# Altium schematic symbol library jlcpcb_2025_04_inductors_extended_0402.schlib: 1396 symbols (part 1 of 8) (continued)
## CMCC1005C5N1SSP
designator L?  Inductance: 5.1nH
Inductor, 5.1nH, 0.26Ω, 400mA, SMD 0402; Manufacturer: Cybermax; Manufacturer Part Number: CMCC1005C5N1SSP; Self-Resonant Frequency: 4600MHz; Q Factor: 8@100MHz; Package Size: 0402; JLCPCB Basic Part: No; JLCPCB Part Number: C405022; Supplier 1: LCSC; Category: Inductors; Supplier Part Number 1: C405022; Rated Current: 400mA; DC Resistance: 0.26Ω; RoHS: Yes; ComponentLink1Description: Datasheet; ComponentLink1URL: https://wmsc.lcsc.com/wmsc/upload/file/pdf/v2/lcsc/2304140030_Cybermax-CMCC1005C5N1SSP_C405022.pdf; ComponentLink2Description: JLCPCB Part URL; ComponentLink2URL: https://jlcpcb.com/partdetail/C405022; ComponentLink3Description: LCSC Part URL; ComponentLink3URL: https://lcsc.com/product-detail/Inductors-SMD_Cybermax-Cybermax-CMCC1005C5N1SSP_C405022.html
footprint IND-0402 (0402 (1005M) Inductor)
pins: 1, 2

## CMCC1005C6N8SSP
designator L?  Inductance: 6.8nH
Inductor, 6.8nH, SMD 0402; Manufacturer: Cybermax; Manufacturer Part Number: CMCC1005C6N8SSP; Package Size: 0402; JLCPCB Basic Part: No; JLCPCB Part Number: C405025; Supplier 1: LCSC; Category: Inductors; Supplier Part Number 1: C405025; RoHS: Yes; ComponentLink1Description: Datasheet; ComponentLink1URL: https://wmsc.lcsc.com/wmsc/upload/file/pdf/v2/lcsc/2304140030_Cybermax-CMCC1005C6N8SSP_C405025.pdf; ComponentLink2Description: JLCPCB Part URL; ComponentLink2URL: https://jlcpcb.com/partdetail/C405025; ComponentLink3Description: LCSC Part URL; ComponentLink3URL: https://lcsc.com/product-detail/Inductors-SMD_Cybermax-Cybermax-CMCC1005C6N8SSP_C405025.html
footprint IND-0402 (0402 (1005M) Inductor)
pins: 1, 2

## CMCC1005C9N1JSP
designator L?  Inductance: 9.1nH
Inductor, 9.1nH, ±5%, 0.42Ω, 300mA, SMD 0402; Manufacturer: Cybermax; Manufacturer Part Number: CMCC1005C9N1JSP; Self-Resonant Frequency: 3200MHz; Q Factor: 8@100MHz; Package Size: 0402; JLCPCB Basic Part: No; JLCPCB Part Number: C405028; Supplier 1: LCSC; Category: Inductors; Supplier Part Number 1: C405028; Tolerance: ±5%; Rated Current: 300mA; DC Resistance: 0.42Ω; RoHS: Yes; ComponentLink1Description: Datasheet; ComponentLink1URL: https://wmsc.lcsc.com/wmsc/upload/file/pdf/v2/lcsc/2304140030_Cybermax-CMCC1005C9N1JSP_C405028.pdf; ComponentLink2Description: JLCPCB Part URL; ComponentLink2URL: https://jlcpcb.com/partdetail/C405028; ComponentLink3Description: LCSC Part URL; ComponentLink3URL: https://lcsc.com/product-detail/Inductors-SMD_Cybermax-Cybermax-CMCC1005C9N1JSP_C405028.html
footprint IND-0402 (0402 (1005M) Inductor)
pins: 1, 2

## CMCC1005C27NJSP
designator L?  Inductance: 27nH
Inductor, 27nH, ±5%, 0.9Ω, 200mA, SMD 0402; Manufacturer: Cybermax; Manufacturer Part Number: CMCC1005C27NJSP; Self-Resonant Frequency: 1.6GHz; Q Factor: 8@100MHz; Package Size: 0402; JLCPCB Basic Part: No; JLCPCB Part Number: C405034; Supplier 1: LCSC; Category: Inductors; Supplier Part Number 1: C405034; Tolerance: ±5%; Rated Current: 200mA; DC Resistance: 0.9Ω; RoHS: Yes; ComponentLink1Description: Datasheet; ComponentLink1URL: https://wmsc.lcsc.com/wmsc/upload/file/pdf/v2/lcsc/2304140030_Cybermax-CMCC1005C27NJSP_C405034.pdf; ComponentLink2Description: JLCPCB Part URL; ComponentLink2URL: https://jlcpcb.com/partdetail/C405034; ComponentLink3Description: LCSC Part URL; ComponentLink3URL: https://lcsc.com/product-detail/Inductors-SMD_Cybermax-Cybermax-CMCC1005C27NJSP_C405034.html
footprint IND-0402 (0402 (1005M) Inductor)
pins: 1, 2

## CMCC1005C39NJSP
designator L?  Inductance: 39nH
Inductor, 39nH, ±5%, 1.2Ω, 150mA, SMD 0402; Manufacturer: Cybermax; Manufacturer Part Number: CMCC1005C39NJSP; Self-Resonant Frequency: 1.2GHz; Q Factor: 8@100MHz; Package Size: 0402; JLCPCB Basic Part: No; JLCPCB Part Number: C405036; Supplier 1: LCSC; Category: Inductors; Supplier Part Number 1: C405036; Tolerance: ±5%; Rated Current: 150mA; DC Resistance: 1.2Ω; RoHS: Yes; ComponentLink1Description: Datasheet; ComponentLink1URL: https://wmsc.lcsc.com/wmsc/upload/file/pdf/v2/lcsc/2304140030_Cybermax-CMCC1005C39NJSP_C405036.pdf; ComponentLink2Description: JLCPCB Part URL; ComponentLink2URL: https://jlcpcb.com/partdetail/C405036; ComponentLink3Description: LCSC Part URL; ComponentLink3URL: https://lcsc.com/product-detail/Inductors-SMD_Cybermax-Cybermax-CMCC1005C39NJSP_C405036.html
footprint IND-0402 (0402 (1005M) Inductor)
pins: 1, 2

## CMCC1005C47NJSP
designator L?  Inductance: 47nH
Inductor, 47nH, ±5%, 1.3Ω, 150mA, SMD 0402; Manufacturer: Cybermax; Manufacturer Part Number: CMCC1005C47NJSP; Self-Resonant Frequency: 1GHz; Q Factor: 8@100MHz; Package Size: 0402; JLCPCB Basic Part: No; JLCPCB Part Number: C405037; Supplier 1: LCSC; Category: Inductors; Supplier Part Number 1: C405037; Tolerance: ±5%; Rated Current: 150mA; DC Resistance: 1.3Ω; RoHS: Yes; ComponentLink1Description: Datasheet; ComponentLink1URL: https://wmsc.lcsc.com/wmsc/upload/file/pdf/v2/lcsc/2304140030_Cybermax-CMCC1005C47NJSP_C405037.pdf; ComponentLink2Description: JLCPCB Part URL; ComponentLink2URL: https://jlcpcb.com/partdetail/C405037; ComponentLink3Description: LCSC Part URL; ComponentLink3URL: https://lcsc.com/product-detail/Inductors-SMD_Cybermax-Cybermax-CMCC1005C47NJSP_C405037.html
footprint IND-0402 (0402 (1005M) Inductor)
pins: 1, 2

## CMCC1005CR10JSP
designator L?  Inductance: 100nH
Inductor, 100nH, ±5%, 2.6Ω, 150mA, SMD 0402; Manufacturer: Cybermax; Manufacturer Part Number: CMCC1005CR10JSP; Self-Resonant Frequency: 700MHz; Q Factor: 8@100MHz; Package Size: 0402; JLCPCB Basic Part: No; JLCPCB Part Number: C405041; Supplier 1: LCSC; Category: Inductors; Supplier Part Number 1: C405041; Tolerance: ±5%; Rated Current: 150mA; DC Resistance: 2.6Ω; RoHS: Yes; ComponentLink1Description: Datasheet; ComponentLink1URL: https://wmsc.lcsc.com/wmsc/upload/file/pdf/v2/lcsc/2304140030_Cybermax-CMCC1005CR10JSP_C405041.pdf; ComponentLink2Description: JLCPCB Part URL; ComponentLink2URL: https://jlcpcb.com/partdetail/C405041; ComponentLink3Description: LCSC Part URL; ComponentLink3URL: https://lcsc.com/product-detail/Inductors-SMD_Cybermax-Cybermax-CMCC1005CR10JSP_C405041.html
footprint IND-0402 (0402 (1005M) Inductor)
pins: 1, 2

## CMCC1005CR12JSP
designator L?  Inductance: 120nH
Inductor, 120nH, ±5%, 2.8Ω, 150mA, SMD 0402; Manufacturer: Cybermax; Manufacturer Part Number: CMCC1005CR12JSP; Self-Resonant Frequency: 600MHz; Q Factor: 8@100MHz; Package Size: 0402; JLCPCB Basic Part: No; JLCPCB Part Number: C405042; Supplier 1: LCSC; Category: Inductors; Supplier Part Number 1: C405042; Tolerance: ±5%; Rated Current: 150mA; DC Resistance: 2.8Ω; RoHS: Yes; ComponentLink1Description: Datasheet; ComponentLink1URL: https://wmsc.lcsc.com/wmsc/upload/file/pdf/v2/lcsc/2304140030_Cybermax-CMCC1005CR12JSP_C405042.pdf; ComponentLink2Description: JLCPCB Part URL; ComponentLink2URL: https://jlcpcb.com/partdetail/C405042; ComponentLink3Description: LCSC Part URL; ComponentLink3URL: https://lcsc.com/product-detail/Inductors-SMD_Cybermax-Cybermax-CMCC1005CR12JSP_C405042.html
footprint IND-0402 (0402 (1005M) Inductor)
pins: 1, 2

## CMCC1005CR15JSP
designator L?  Inductance: 150nH
Inductor, 150nH, ±5%, 3.2Ω, 100mA, SMD 0402; Manufacturer: Cybermax; Manufacturer Part Number: CMCC1005CR15JSP; Self-Resonant Frequency: 550MHz; Q Factor: 8@100MHz; Package Size: 0402; JLCPCB Basic Part: No; JLCPCB Part Number: C405043; Supplier 1: LCSC; Category: Inductors; Supplier Part Number 1: C405043; Tolerance: ±5%; Rated Current: 100mA; DC Resistance: 3.2Ω; RoHS: Yes; ComponentLink1Description: Datasheet; ComponentLink1URL: https://wmsc.lcsc.com/wmsc/upload/file/pdf/v2/lcsc/2304140030_Cybermax-CMCC1005CR15JSP_C405043.pdf; ComponentLink2Description: JLCPCB Part URL; ComponentLink2URL: https://jlcpcb.com/partdetail/C405043; ComponentLink3Description: LCSC Part URL; ComponentLink3URL: https://lcsc.com/product-detail/Inductors-SMD_Cybermax-Cybermax-CMCC1005CR15JSP_C405043.html
footprint IND-0402 (0402 (1005M) Inductor)
pins: 1, 2

## CMCC1005CR18JSP
designator L?  Inductance: 180nH
Inductor, 180nH, ±5%, 3.7Ω, 100mA, SMD 0402; Manufacturer: Cybermax; Manufacturer Part Number: CMCC1005CR18JSP; Self-Resonant Frequency: 500MHz; Q Factor: 8@100MHz; Package Size: 0402; JLCPCB Basic Part: No; JLCPCB Part Number: C405044; Supplier 1: LCSC; Category: Inductors; Supplier Part Number 1: C405044; Tolerance: ±5%; Rated Current: 100mA; DC Resistance: 3.7Ω; RoHS: Yes; ComponentLink1Description: Datasheet; ComponentLink1URL: https://wmsc.lcsc.com/wmsc/upload/file/pdf/v2/lcsc/2304140030_Cybermax-CMCC1005CR18JSP_C405044.pdf; ComponentLink2Description: JLCPCB Part URL; ComponentLink2URL: https://jlcpcb.com/partdetail/C405044; ComponentLink3Description: LCSC Part URL; ComponentLink3URL: https://lcsc.com/product-detail/Inductors-SMD_Cybermax-Cybermax-CMCC1005CR18JSP_C405044.html
footprint IND-0402 (0402 (1005M) Inductor)
pins: 1, 2

## CMCC1005CR27JSP
designator L?  Inductance: 270nH
Inductor, 270nH, ±5%, 4.5Ω, 100mA, SMD 0402; Manufacturer: Cybermax; Manufacturer Part Number: CMCC1005CR27JSP; Self-Resonant Frequency: 400MHz; Q Factor: 8@100MHz; Package Size: 0402; JLCPCB Basic Part: No; JLCPCB Part Number: C405046; Supplier 1: LCSC; Category: Inductors; Supplier Part Number 1: C405046; Tolerance: ±5%; Rated Current: 100mA; DC Resistance: 4.5Ω; RoHS: Yes; ComponentLink1Description: Datasheet; ComponentLink1URL: https://wmsc.lcsc.com/wmsc/upload/file/pdf/v2/lcsc/2304140030_Cybermax-CMCC1005CR27JSP_C405046.pdf; ComponentLink2Description: JLCPCB Part URL; ComponentLink2URL: https://jlcpcb.com/partdetail/C405046; ComponentLink3Description: LCSC Part URL; ComponentLink3URL: https://lcsc.com/product-detail/Inductors-SMD_Cybermax-Cybermax-CMCC1005CR27JSP_C405046.html
footprint IND-0402 (0402 (1005M) Inductor)
pins: 1, 2

## CMCC1005CR33JSP
designator L?  Inductance: 330nH
Inductor, 330nH, ±5%, 7Ω, 50mA, SMD 0402; Manufacturer: Cybermax; Manufacturer Part Number: CMCC1005CR33JSP; Self-Resonant Frequency: 350MHz; Q Factor: 5@50MHz; Package Size: 0402; JLCPCB Basic Part: No; JLCPCB Part Number: C405048; Supplier 1: LCSC; Category: Inductors; Supplier Part Number 1: C405048; Tolerance: ±5%; Rated Current: 50mA; DC Resistance: 7Ω; RoHS: Yes; ComponentLink1Description: Datasheet; ComponentLink1URL: https://wmsc.lcsc.com/wmsc/upload/file/pdf/v2/lcsc/2304140030_Cybermax-CMCC1005CR33JSP_C405048.pdf; ComponentLink2Description: JLCPCB Part URL; ComponentLink2URL: https://jlcpcb.com/partdetail/C405048; ComponentLink3Description: LCSC Part URL; ComponentLink3URL: https://lcsc.com/product-detail/Inductors-SMD_Cybermax-Cybermax-CMCC1005CR33JSP_C405048.html
footprint IND-0402 (0402 (1005M) Inductor)
pins: 1, 2

## CS0402-1N0B-S
designator L?  Inductance: 1nH
Inductor, 1nH, 45mΩ, 1.36A, SMD 0402; Manufacturer: Chilisin Elec; Manufacturer Part Number: CS0402-1N0B-S; Self-Resonant Frequency: 12.7MHz; Q Factor: 16@250MHz; Package Size: 0402; JLCPCB Basic Part: No; JLCPCB Part Number: C142190; Supplier 1: LCSC; Category: Inductors; Supplier Part Number 1: C142190; Rated Current: 1.36A; DC Resistance: 45mΩ; RoHS: Yes; ComponentLink1Description: Datasheet; ComponentLink1URL: https://wmsc.lcsc.com/wmsc/upload/file/pdf/v2/lcsc/2304140030_Chilisin-Elec-CS0402-1N0B-S_C142190.pdf; ComponentLink2Description: JLCPCB Part URL; ComponentLink2URL: https://jlcpcb.com/partdetail/C142190; ComponentLink3Description: LCSC Part URL; ComponentLink3URL: https://lcsc.com/product-detail/Inductors-SMD_Chilisin-Elec-Chilisin-Elec-CS0402-1N0B-S_C142190.html
footprint IND-0402 (0402 (1005M) Inductor)
pins: 1, 2

## CS0402-1N0J-S
designator L?  Inductance: 1nH
Inductor, 1nH, ±5%, 45mΩ, 1.36A, SMD 0402; Manufacturer: Chilisin Elec; Manufacturer Part Number: CS0402-1N0J-S; Self-Resonant Frequency: 12.7MHz; Q Factor: 16@250MHz; Package Size: 0402; JLCPCB Basic Part: No; JLCPCB Part Number: C142189; Supplier 1: LCSC; Category: Inductors; Supplier Part Number 1: C142189; Tolerance: ±5%; Rated Current: 1.36A; DC Resistance: 45mΩ; RoHS: Yes; ComponentLink1Description: Datasheet; ComponentLink1URL: https://wmsc.lcsc.com/wmsc/upload/file/pdf/v2/lcsc/2304140030_Chilisin-Elec-CS0402-1N0J-S_C142189.pdf; ComponentLink2Description: JLCPCB Part URL; ComponentLink2URL: https://jlcpcb.com/partdetail/C142189; ComponentLink3Description: LCSC Part URL; ComponentLink3URL: https://lcsc.com/product-detail/Inductors-SMD_Chilisin-Elec-Chilisin-Elec-CS0402-1N0J-S_C142189.html
footprint IND-0402 (0402 (1005M) Inductor)
pins: 1, 2

## CS0402-1N2B-S
designator L?  Inductance: 1.2nH
Inductor, 1.2nH, 140mΩ, 640mA, SMD 0402; Manufacturer: Chilisin Elec; Manufacturer Part Number: CS0402-1N2B-S; Self-Resonant Frequency: 10.4MHz; Q Factor: 10@250MHz; Package Size: 0402; JLCPCB Basic Part: No; JLCPCB Part Number: C142188; Supplier 1: LCSC; Category: Inductors; Supplier Part Number 1: C142188; Rated Current: 640mA; DC Resistance: 140mΩ; RoHS: Yes; ComponentLink1Description: Datasheet; ComponentLink1URL: https://wmsc.lcsc.com/wmsc/upload/file/pdf/v2/lcsc/2304140030_Chilisin-Elec-CS0402-1N2B-S_C142188.pdf; ComponentLink2Description: JLCPCB Part URL; ComponentLink2URL: https://jlcpcb.com/partdetail/C142188; ComponentLink3Description: LCSC Part URL; ComponentLink3URL: https://lcsc.com/product-detail/Inductors-SMD_Chilisin-Elec-Chilisin-Elec-CS0402-1N2B-S_C142188.html
footprint IND-0402 (0402 (1005M) Inductor)
pins: 1, 2

## CS0402-1N9B-S
designator L?  Inductance: 1.9nH
Inductor, 1.9nH, 70mΩ, 1.04A, SMD 0402; Manufacturer: Chilisin Elec; Manufacturer Part Number: CS0402-1N9B-S; Self-Resonant Frequency: 11.3MHz; Q Factor: 16@250MHz; Package Size: 0402; JLCPCB Basic Part: No; JLCPCB Part Number: C142187; Supplier 1: LCSC; Category: Inductors; Supplier Part Number 1: C142187; Rated Current: 1.04A; DC Resistance: 70mΩ; RoHS: Yes; ComponentLink1Description: Datasheet; ComponentLink1URL: https://wmsc.lcsc.com/wmsc/upload/file/pdf/v2/lcsc/2304140030_Chilisin-Elec-CS0402-1N9B-S_C142187.pdf; ComponentLink2Description: JLCPCB Part URL; ComponentLink2URL: https://jlcpcb.com/partdetail/C142187; ComponentLink3Description: LCSC Part URL; ComponentLink3URL: https://lcsc.com/product-detail/Inductors-SMD_Chilisin-Elec-Chilisin-Elec-CS0402-1N9B-S_C142187.html
footprint IND-0402 (0402 (1005M) Inductor)
pins: 1, 2

## CS0402-1N9G-S
designator L?  Inductance: 1.9nH
Inductor, 1.9nH, ±2%, 0.07Ω, 1.04A, SMD 0402; Manufacturer: Chilisin Elec; Manufacturer Part Number: CS0402-1N9G-S; Self-Resonant Frequency: 11.3GHz; Q Factor: 16@250MHz; Package Size: 0402; JLCPCB Basic Part: No; JLCPCB Part Number: C2913994; Supplier 1: LCSC; Category: Inductors; Supplier Part Number 1: C2913994; Tolerance: ±2%; Rated Current: 1.04A; DC Resistance: 0.07Ω; RoHS: Yes; ComponentLink1Description: Datasheet; ComponentLink1URL: https://wmsc.lcsc.com/wmsc/upload/file/pdf/v2/lcsc/2111051730_Chilisin-Elec-CS0402-1N9G-S_C2913994.pdf; ComponentLink2Description: JLCPCB Part URL; ComponentLink2URL: https://jlcpcb.com/partdetail/C2913994; ComponentLink3Description: LCSC Part URL; ComponentLink3URL: https://lcsc.com/product-detail/Inductors-SMD_Chilisin-Elec-Chilisin-Elec-CS0402-1N9G-S_C2913994.html
footprint IND-0402 (0402 (1005M) Inductor)
pins: 1, 2

## CS0402-1N9J-S
designator L?  Inductance: 1.9nH
Inductor, 1.9nH, ±5%, 70mΩ, 1.04A, SMD 0402; Manufacturer: Chilisin Elec; Manufacturer Part Number: CS0402-1N9J-S; Self-Resonant Frequency: 11.3MHz; Q Factor: 16@250MHz; Package Size: 0402; JLCPCB Basic Part: No; JLCPCB Part Number: C285961; Supplier 1: LCSC; Category: Inductors; Supplier Part Number 1: C285961; Tolerance: ±5%; Rated Current: 1.04A; DC Resistance: 70mΩ; RoHS: Yes; ComponentLink1Description: Datasheet; ComponentLink1URL: https://wmsc.lcsc.com/wmsc/upload/file/pdf/v2/lcsc/2304140030_Chilisin-Elec-CS0402-1N9J-S_C285961.pdf; ComponentLink2Description: JLCPCB Part URL; ComponentLink2URL: https://jlcpcb.com/partdetail/C285961; ComponentLink3Description: LCSC Part URL; ComponentLink3URL: https://lcsc.com/product-detail/Inductors-SMD_Chilisin-Elec-Chilisin-Elec-CS0402-1N9J-S_C285961.html
footprint IND-0402 (0402 (1005M) Inductor)
pins: 1, 2

## CS0402-2N7B-S
designator L?  Inductance: 2.7nH
Inductor, 2.7nH, 120mΩ, 640mA, SMD 0402; Manufacturer: Chilisin Elec; Manufacturer Part Number: CS0402-2N7B-S; Self-Resonant Frequency: 10.4MHz; Q Factor: 16@250MHz; Package Size: 0402; JLCPCB Basic Part: No; JLCPCB Part Number: C142182; Supplier 1: LCSC; Category: Inductors; Supplier Part Number 1: C142182; Rated Current: 640mA; DC Resistance: 120mΩ; RoHS: Yes; ComponentLink1Description: Datasheet; ComponentLink1URL: https://wmsc.lcsc.com/wmsc/upload/file/pdf/v2/lcsc/2304140030_Chilisin-Elec-CS0402-2N7B-S_C142182.pdf; ComponentLink2Description: JLCPCB Part URL; ComponentLink2URL: https://jlcpcb.com/partdetail/C142182; ComponentLink3Description: LCSC Part URL; ComponentLink3URL: https://lcsc.com/product-detail/Inductors-SMD_Chilisin-Elec-Chilisin-Elec-CS0402-2N7B-S_C142182.html
footprint IND-0402 (0402 (1005M) Inductor)
pins: 1, 2

## CS0402-2N7J-S
designator L?  Inductance: 2.7nH
Inductor, 2.7nH, ±5%, 120mΩ, 640mA, SMD 0402; Manufacturer: Chilisin Elec; Manufacturer Part Number: CS0402-2N7J-S; Self-Resonant Frequency: 10.4MHz; Q Factor: 16@250MHz; Package Size: 0402; JLCPCB Basic Part: No; JLCPCB Part Number: C142181; Supplier 1: LCSC; Category: Inductors; Supplier Part Number 1: C142181; Tolerance: ±5%; Rated Current: 640mA; DC Resistance: 120mΩ; RoHS: Yes; ComponentLink1Description: Datasheet; ComponentLink1URL: https://wmsc.lcsc.com/wmsc/upload/file/pdf/v2/lcsc/2304140030_Chilisin-Elec-CS0402-2N7J-S_C142181.pdf; ComponentLink2Description: JLCPCB Part URL; ComponentLink2URL: https://jlcpcb.com/partdetail/C142181; ComponentLink3Description: LCSC Part URL; ComponentLink3URL: https://lcsc.com/product-detail/Inductors-SMD_Chilisin-Elec-Chilisin-Elec-CS0402-2N7J-S_C142181.html
footprint IND-0402 (0402 (1005M) Inductor)
pins: 1, 2

## CS0402-3N3G-S
designator L?  Inductance: 3.3nH
Inductor, 3.3nH, ±2%, 66mΩ, 840mA, SMD 0402; Manufacturer: Chilisin Elec; Manufacturer Part Number: CS0402-3N3G-S; Self-Resonant Frequency: 7MHz; Q Factor: 19@250MHz; Package Size: 0402; JLCPCB Basic Part: No; JLCPCB Part Number: C142180; Supplier 1: LCSC; Category: Inductors; Supplier Part Number 1: C142180; Tolerance: ±2%; Rated Current: 840mA; DC Resistance: 66mΩ; RoHS: Yes; ComponentLink1Description: Datasheet; ComponentLink1URL: https://wmsc.lcsc.com/wmsc/upload/file/pdf/v2/lcsc/2304140030_Chilisin-Elec-CS0402-3N3G-S_C142180.pdf; ComponentLink2Description: JLCPCB Part URL; ComponentLink2URL: https://jlcpcb.com/partdetail/C142180; ComponentLink3Description: LCSC Part URL; ComponentLink3URL: https://lcsc.com/product-detail/Inductors-SMD_Chilisin-Elec-Chilisin-Elec-CS0402-3N3G-S_C142180.html
footprint IND-0402 (0402 (1005M) Inductor)
pins: 1, 2

## CS0402-3N3H-S
designator L?  Inductance: 3.3nH
Inductor, 3.3nH, ±3%, 66mΩ, 840mA, SMD 0402; Manufacturer: Chilisin Elec; Manufacturer Part Number: CS0402-3N3H-S; Self-Resonant Frequency: 7MHz; Q Factor: 19@250MHz; Package Size: 0402; JLCPCB Basic Part: No; JLCPCB Part Number: C280259; Supplier 1: LCSC; Category: Inductors; Supplier Part Number 1: C280259; Tolerance: ±3%; Rated Current: 840mA; DC Resistance: 66mΩ; RoHS: Yes; ComponentLink1Description: Datasheet; ComponentLink1URL: https://wmsc.lcsc.com/wmsc/upload/file/pdf/v2/lcsc/2304140030_Chilisin-Elec-CS0402-3N3H-S_C280259.pdf; ComponentLink2Description: JLCPCB Part URL; ComponentLink2URL: https://jlcpcb.com/partdetail/C280259; ComponentLink3Description: LCSC Part URL; ComponentLink3URL: https://lcsc.com/product-detail/Inductors-SMD_Chilisin-Elec-Chilisin-Elec-CS0402-3N3H-S_C280259.html
footprint IND-0402 (0402 (1005M) Inductor)
pins: 1, 2

## CS0402-3N3J-S
designator L?  Inductance: 3.3nH
Inductor, 3.3nH, ±5%, 66mΩ, 840mA, SMD 0402; Manufacturer: Chilisin Elec; Manufacturer Part Number: CS0402-3N3J-S; Self-Resonant Frequency: 7MHz; Q Factor: 19@250MHz; Package Size: 0402; JLCPCB Basic Part: No; JLCPCB Part Number: C142179; Supplier 1: LCSC; Category: Inductors; Supplier Part Number 1: C142179; Tolerance: ±5%; Rated Current: 840mA; DC Resistance: 66mΩ; RoHS: Yes; ComponentLink1Description: Datasheet; ComponentLink1URL: https://wmsc.lcsc.com/wmsc/upload/file/pdf/v2/lcsc/2304140030_Chilisin-Elec-CS0402-3N3J-S_C142179.pdf; ComponentLink2Description: JLCPCB Part URL; ComponentLink2URL: https://jlcpcb.com/partdetail/C142179; ComponentLink3Description: LCSC Part URL; ComponentLink3URL: https://lcsc.com/product-detail/Inductors-SMD_Chilisin-Elec-Chilisin-Elec-CS0402-3N3J-S_C142179.html
footprint IND-0402 (0402 (1005M) Inductor)
pins: 1, 2

## CS0402-3N9G-S
designator L?  Inductance: 3.9nH
Inductor, 3.9nH, ±2%, 66mΩ, 840mA, SMD 0402; Manufacturer: Chilisin Elec; Manufacturer Part Number: CS0402-3N9G-S; Self-Resonant Frequency: 6MHz; Q Factor: 19@250MHz; Package Size: 0402; JLCPCB Basic Part: No; JLCPCB Part Number: C285959; Supplier 1: LCSC; Category: Inductors; Supplier Part Number 1: C285959; Tolerance: ±2%; Rated Current: 840mA; DC Resistance: 66mΩ; RoHS: Yes; ComponentLink1Description: Datasheet; ComponentLink1URL: https://wmsc.lcsc.com/wmsc/upload/file/pdf/v2/lcsc/2304140030_Chilisin-Elec-CS0402-3N9G-S_C285959.pdf; ComponentLink2Description: JLCPCB Part URL; ComponentLink2URL: https://jlcpcb.com/partdetail/C285959; ComponentLink3Description: LCSC Part URL; ComponentLink3URL: https://lcsc.com/product-detail/Inductors-SMD_Chilisin-Elec-Chilisin-Elec-CS0402-3N9G-S_C285959.html
footprint IND-0402 (0402 (1005M) Inductor)
pins: 1, 2

## CS0402-3N9H-S
designator L?  Inductance: 3.9nH
Inductor, 3.9nH, ±3%, 66mΩ, 840mA, SMD 0402; Manufacturer: Chilisin Elec; Manufacturer Part Number: CS0402-3N9H-S; Self-Resonant Frequency: 6MHz; Q Factor: 19@250MHz; Package Size: 0402; JLCPCB Basic Part: No; JLCPCB Part Number: C285958; Supplier 1: LCSC; Category: Inductors; Supplier Part Number 1: C285958; Tolerance: ±3%; Rated Current: 840mA; DC Resistance: 66mΩ; RoHS: Yes; ComponentLink1Description: Datasheet; ComponentLink1URL: https://wmsc.lcsc.com/wmsc/upload/file/pdf/v2/lcsc/2304140030_Chilisin-Elec-CS0402-3N9H-S_C285958.pdf; ComponentLink2Description: JLCPCB Part URL; ComponentLink2URL: https://jlcpcb.com/partdetail/C285958; ComponentLink3Description: LCSC Part URL; ComponentLink3URL: https://lcsc.com/product-detail/Inductors-SMD_Chilisin-Elec-Chilisin-Elec-CS0402-3N9H-S_C285958.html
footprint IND-0402 (0402 (1005M) Inductor)
pins: 1, 2

## CS0402-3N9J-S
designator L?  Inductance: 3.9nH
Inductor, 3.9nH, ±5%, 66mΩ, 840mA, SMD 0402; Manufacturer: Chilisin Elec; Manufacturer Part Number: CS0402-3N9J-S; Self-Resonant Frequency: 6MHz; Q Factor: 19@250MHz; Package Size: 0402; JLCPCB Basic Part: No; JLCPCB Part Number: C329623; Supplier 1: LCSC; Category: Inductors; Supplier Part Number 1: C329623; Tolerance: ±5%; Rated Current: 840mA; DC Resistance: 66mΩ; RoHS: Yes; ComponentLink1Description: Datasheet; ComponentLink1URL: https://wmsc.lcsc.com/wmsc/upload/file/pdf/v2/lcsc/2304140030_Chilisin-Elec-CS0402-3N9J-S_C329623.pdf; ComponentLink2Description: JLCPCB Part URL; ComponentLink2URL: https://jlcpcb.com/partdetail/C329623; ComponentLink3Description: LCSC Part URL; ComponentLink3URL: https://lcsc.com/product-detail/Inductors-SMD_Chilisin-Elec-Chilisin-Elec-CS0402-3N9J-S_C329623.html
footprint IND-0402 (0402 (1005M) Inductor)
pins: 1, 2

## CS0402-5N6G-S
designator L?  Inductance: 5.6nH
Inductor, 5.6nH, ±2%, 83mΩ, 760mA, SMD 0402; Manufacturer: Chilisin Elec; Manufacturer Part Number: CS0402-5N6G-S; Self-Resonant Frequency: 4.8MHz; Q Factor: 20@250MHz; Package Size: 0402; JLCPCB Basic Part: No; JLCPCB Part Number: C142177; Supplier 1: LCSC; Category: Inductors; Supplier Part Number 1: C142177; Tolerance: ±2%; Rated Current: 760mA; DC Resistance: 83mΩ; RoHS: Yes; ComponentLink1Description: Datasheet; ComponentLink1URL: https://wmsc.lcsc.com/wmsc/upload/file/pdf/v2/lcsc/2304140030_Chilisin-Elec-CS0402-5N6G-S_C142177.pdf; ComponentLink2Description: JLCPCB Part URL; ComponentLink2URL: https://jlcpcb.com/partdetail/C142177; ComponentLink3Description: LCSC Part URL; ComponentLink3URL: https://lcsc.com/product-detail/Inductors-SMD_Chilisin-Elec-Chilisin-Elec-CS0402-5N6G-S_C142177.html
footprint IND-0402 (0402 (1005M) Inductor)
pins: 1, 2

## CS0402-5N6J-S
designator L?  Inductance: 5.6nH
Inductor, 5.6nH, ±5%, 83mΩ, 760mA, SMD 0402; Manufacturer: Chilisin Elec; Manufacturer Part Number: CS0402-5N6J-S; Self-Resonant Frequency: 4.8MHz; Q Factor: 20@250MHz; Package Size: 0402; JLCPCB Basic Part: No; JLCPCB Part Number: C285956; Supplier 1: LCSC; Category: Inductors; Supplier Part Number 1: C285956; Tolerance: ±5%; Rated Current: 760mA; DC Resistance: 83mΩ; RoHS: Yes; ComponentLink1Description: Datasheet; ComponentLink1URL: https://wmsc.lcsc.com/wmsc/upload/file/pdf/v2/lcsc/2304140030_Chilisin-Elec-CS0402-5N6J-S_C285956.pdf; ComponentLink2Description: JLCPCB Part URL; ComponentLink2URL: https://jlcpcb.com/partdetail/C285956; ComponentLink3Description: LCSC Part URL; ComponentLink3URL: https://lcsc.com/product-detail/Inductors-SMD_Chilisin-Elec-Chilisin-Elec-CS0402-5N6J-S_C285956.html
footprint IND-0402 (0402 (1005M) Inductor)
pins: 1, 2

## CS0402-6N2J-S
designator L?  Inductance: 6.2nH
Inductor, 6.2nH, ±5%, 83mΩ, 760mA, SMD 0402; Manufacturer: Chilisin Elec; Manufacturer Part Number: CS0402-6N2J-S; Self-Resonant Frequency: 4.8MHz; Q Factor: 20@250MHz; Package Size: 0402; JLCPCB Basic Part: No; JLCPCB Part Number: C329624; Supplier 1: LCSC; Category: Inductors; Supplier Part Number 1: C329624; Tolerance: ±5%; Rated Current: 760mA; DC Resistance: 83mΩ; RoHS: Yes; ComponentLink1Description: Datasheet; ComponentLink1URL: https://wmsc.lcsc.com/wmsc/upload/file/pdf/v2/lcsc/2304140030_Chilisin-Elec-CS0402-6N2J-S_C329624.pdf; ComponentLink2Description: JLCPCB Part URL; ComponentLink2URL: https://jlcpcb.com/partdetail/C329624; ComponentLink3Description: LCSC Part URL; ComponentLink3URL: https://lcsc.com/product-detail/Inductors-SMD_Chilisin-Elec-Chilisin-Elec-CS0402-6N2J-S_C329624.html
footprint IND-0402 (0402 (1005M) Inductor)
pins: 1, 2

## CS0402-6N8J-S
designator L?  Inductance: 6.8nH
Inductor, 6.8nH, ±5%, 83mΩ, 680mA, SMD 0402; Manufacturer: Chilisin Elec; Manufacturer Part Number: CS0402-6N8J-S; Self-Resonant Frequency: 4.8MHz; Q Factor: 20@250MHz; Package Size: 0402; JLCPCB Basic Part: No; JLCPCB Part Number: C373748; Supplier 1: LCSC; Category: Inductors; Supplier Part Number 1: C373748; Tolerance: ±5%; Rated Current: 680mA; DC Resistance: 83mΩ; RoHS: Yes; ComponentLink1Description: Datasheet; ComponentLink1URL: https://wmsc.lcsc.com/wmsc/upload/file/pdf/v2/lcsc/2304140030_Chilisin-Elec-CS0402-6N8J-S_C373748.pdf; ComponentLink2Description: JLCPCB Part URL; ComponentLink2URL: https://jlcpcb.com/partdetail/C373748; ComponentLink3Description: LCSC Part URL; ComponentLink3URL: https://lcsc.com/product-detail/Inductors-SMD_Chilisin-Elec-Chilisin-Elec-CS0402-6N8J-S_C373748.html
footprint IND-0402 (0402 (1005M) Inductor)
pins: 1, 2

## CS0402-8N2J-S
designator L?  Inductance: 8.2nH
Inductor, 8.2nH, ±5%, 100mΩ, 680mA, SMD 0402; Manufacturer: Chilisin Elec; Manufacturer Part Number: CS0402-8N2J-S; Self-Resonant Frequency: 4.4MHz; Q Factor: 22@250MHz; Package Size: 0402; JLCPCB Basic Part: No; JLCPCB Part Number: C142174; Supplier 1: LCSC; Category: Inductors; Supplier Part Number 1: C142174; Tolerance: ±5%; Rated Current: 680mA; DC Resistance: 100mΩ; RoHS: Yes; ComponentLink1Description: Datasheet; ComponentLink1URL: https://wmsc.lcsc.com/wmsc/upload/file/pdf/v2/lcsc/2304140030_Chilisin-Elec-CS0402-8N2J-S_C142174.pdf; ComponentLink2Description: JLCPCB Part URL; ComponentLink2URL: https://jlcpcb.com/partdetail/C142174; ComponentLink3Description: LCSC Part URL; ComponentLink3URL: https://lcsc.com/product-detail/Inductors-SMD_Chilisin-Elec-Chilisin-Elec-CS0402-8N2J-S_C142174.html
footprint IND-0402 (0402 (1005M) Inductor)
pins: 1, 2

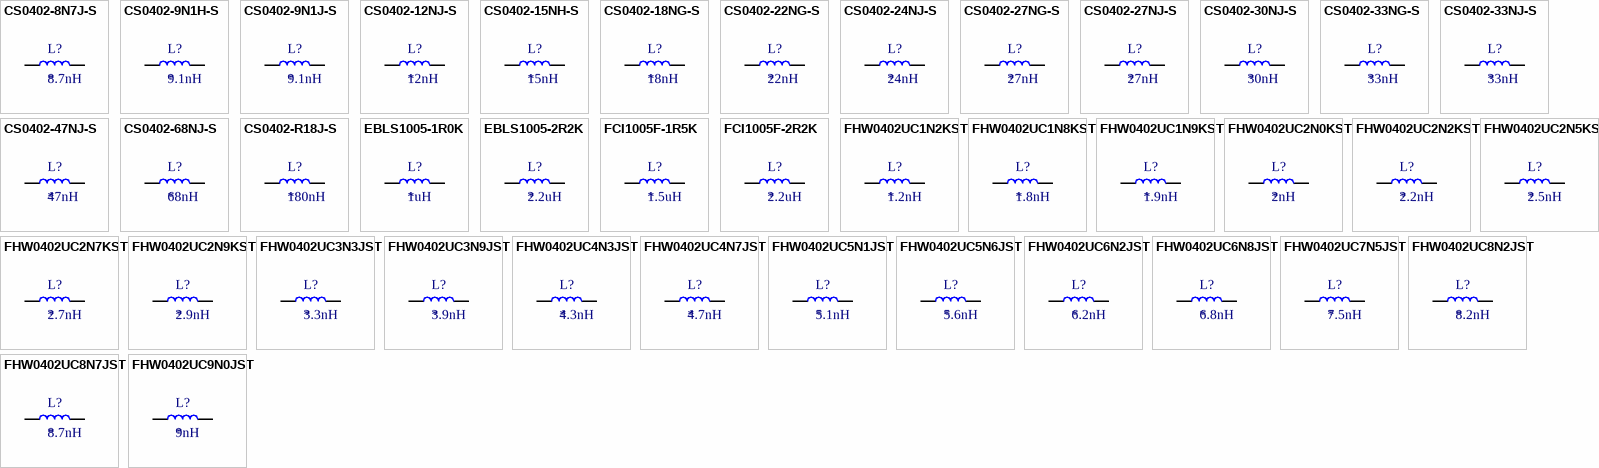
[diagram p3: symbols CS0402-8N7J-S to FHW0402UC9N0JST]

## CS0402-8N7J-S
designator L?  Inductance: 8.7nH
Inductor, 8.7nH, ±5%, 200mΩ, 480mA, SMD 0402; Manufacturer: Chilisin Elec; Manufacturer Part Number: CS0402-8N7J-S; Self-Resonant Frequency: 4.1MHz; Q Factor: 18@250MHz; Package Size: 0402; JLCPCB Basic Part: No; JLCPCB Part Number: C285954; Supplier 1: LCSC; Category: Inductors; Supplier Part Number 1: C285954; Tolerance: ±5%; Rated Current: 480mA; DC Resistance: 200mΩ; RoHS: Yes; ComponentLink1Description: Datasheet; ComponentLink1URL: https://wmsc.lcsc.com/wmsc/upload/file/pdf/v2/lcsc/2304140030_Chilisin-Elec-CS0402-8N7J-S_C285954.pdf; ComponentLink2Description: JLCPCB Part URL; ComponentLink2URL: https://jlcpcb.com/partdetail/C285954; ComponentLink3Description: LCSC Part URL; ComponentLink3URL: https://lcsc.com/product-detail/Inductors-SMD_Chilisin-Elec-Chilisin-Elec-CS0402-8N7J-S_C285954.html
footprint IND-0402 (0402 (1005M) Inductor)
pins: 1, 2

## CS0402-9N1H-S
designator L?  Inductance: 9.1nH
Inductor, 9.1nH, ±3%, 100mΩ, 680mA, SMD 0402; Manufacturer: Chilisin Elec; Manufacturer Part Number: CS0402-9N1H-S; Self-Resonant Frequency: 4.16MHz; Q Factor: 22@250MHz; Package Size: 0402; JLCPCB Basic Part: No; JLCPCB Part Number: C329625; Supplier 1: LCSC; Category: Inductors; Supplier Part Number 1: C329625; Tolerance: ±3%; Rated Current: 680mA; DC Resistance: 100mΩ; RoHS: Yes; ComponentLink1Description: Datasheet; ComponentLink1URL: https://wmsc.lcsc.com/wmsc/upload/file/pdf/v2/lcsc/2304140030_Chilisin-Elec-CS0402-9N1H-S_C329625.pdf; ComponentLink2Description: JLCPCB Part URL; ComponentLink2URL: https://jlcpcb.com/partdetail/C329625; ComponentLink3Description: LCSC Part URL; ComponentLink3URL: https://lcsc.com/product-detail/Inductors-SMD_Chilisin-Elec-Chilisin-Elec-CS0402-9N1H-S_C329625.html
footprint IND-0402 (0402 (1005M) Inductor)
pins: 1, 2

## CS0402-9N1J-S
designator L?  Inductance: 9.1nH
Inductor, 9.1nH, ±5%, 100mΩ, 680mA, SMD 0402; Manufacturer: Chilisin Elec; Manufacturer Part Number: CS0402-9N1J-S; Self-Resonant Frequency: 4.16MHz; Q Factor: 22@250MHz; Package Size: 0402; JLCPCB Basic Part: No; JLCPCB Part Number: C142173; Supplier 1: LCSC; Category: Inductors; Supplier Part Number 1: C142173; Tolerance: ±5%; Rated Current: 680mA; DC Resistance: 100mΩ; RoHS: Yes; ComponentLink1Description: Datasheet; ComponentLink1URL: https://wmsc.lcsc.com/wmsc/upload/file/pdf/v2/lcsc/2304140030_Chilisin-Elec-CS0402-9N1J-S_C142173.pdf; ComponentLink2Description: JLCPCB Part URL; ComponentLink2URL: https://jlcpcb.com/partdetail/C142173; ComponentLink3Description: LCSC Part URL; ComponentLink3URL: https://lcsc.com/product-detail/Inductors-SMD_Chilisin-Elec-Chilisin-Elec-CS0402-9N1J-S_C142173.html
footprint IND-0402 (0402 (1005M) Inductor)
pins: 1, 2

## CS0402-12NJ-S
designator L?  Inductance: 12nH
Inductor, 12nH, ±5%, 120mΩ, 640mA, SMD 0402; Manufacturer: Chilisin Elec; Manufacturer Part Number: CS0402-12NJ-S; Self-Resonant Frequency: 3.6MHz; Q Factor: 24@250MHz; Package Size: 0402; JLCPCB Basic Part: No; JLCPCB Part Number: C142193; Supplier 1: LCSC; Category: Inductors; Supplier Part Number 1: C142193; Tolerance: ±5%; Rated Current: 640mA; DC Resistance: 120mΩ; RoHS: Yes; ComponentLink1Description: Datasheet; ComponentLink1URL: https://wmsc.lcsc.com/wmsc/upload/file/pdf/v2/lcsc/2304140030_Chilisin-Elec-CS0402-12NJ-S_C142193.pdf; ComponentLink2Description: JLCPCB Part URL; ComponentLink2URL: https://jlcpcb.com/partdetail/C142193; ComponentLink3Description: LCSC Part URL; ComponentLink3URL: https://lcsc.com/product-detail/Inductors-SMD_Chilisin-Elec-Chilisin-Elec-CS0402-12NJ-S_C142193.html
footprint IND-0402 (0402 (1005M) Inductor)
pins: 1, 2

## CS0402-15NH-S
designator L?  Inductance: 15nH
Inductor, 15nH, ±3%, 170mΩ, 560mA, SMD 0402; Manufacturer: Chilisin Elec; Manufacturer Part Number: CS0402-15NH-S; Self-Resonant Frequency: 3.28MHz; Q Factor: 24@250MHz; Package Size: 0402; JLCPCB Basic Part: No; JLCPCB Part Number: C329619; Supplier 1: LCSC; Category: Inductors; Supplier Part Number 1: C329619; Tolerance: ±3%; Rated Current: 560mA; DC Resistance: 170mΩ; RoHS: Yes; ComponentLink1Description: Datasheet; ComponentLink1URL: https://wmsc.lcsc.com/wmsc/upload/file/pdf/v2/lcsc/2304140030_Chilisin-Elec-CS0402-15NH-S_C329619.pdf; ComponentLink2Description: JLCPCB Part URL; ComponentLink2URL: https://jlcpcb.com/partdetail/C329619; ComponentLink3Description: LCSC Part URL; ComponentLink3URL: https://lcsc.com/product-detail/Inductors-SMD_Chilisin-Elec-Chilisin-Elec-CS0402-15NH-S_C329619.html
footprint IND-0402 (0402 (1005M) Inductor)
pins: 1, 2

## CS0402-18NG-S
designator L?  Inductance: 18nH
Inductor, 18nH, ±2%, 230mΩ, 420mA, SMD 0402; Manufacturer: Chilisin Elec; Manufacturer Part Number: CS0402-18NG-S; Self-Resonant Frequency: 3.1MHz; Q Factor: 25@250MHz; Package Size: 0402; JLCPCB Basic Part: No; JLCPCB Part Number: C142192; Supplier 1: LCSC; Category: Inductors; Supplier Part Number 1: C142192; Tolerance: ±2%; Rated Current: 420mA; DC Resistance: 230mΩ; RoHS: Yes; ComponentLink1Description: Datasheet; ComponentLink1URL: https://wmsc.lcsc.com/wmsc/upload/file/pdf/v2/lcsc/1811141620_Chilisin-Elec-CS0402-18NG-S_C142192.pdf; ComponentLink2Description: JLCPCB Part URL; ComponentLink2URL: https://jlcpcb.com/partdetail/C142192; ComponentLink3Description: LCSC Part URL; ComponentLink3URL: https://lcsc.com/product-detail/Inductors-SMD_Chilisin-Elec-Chilisin-Elec-CS0402-18NG-S_C142192.html
footprint IND-0402 (0402 (1005M) Inductor)
pins: 1, 2

## CS0402-22NG-S
designator L?  Inductance: 22nH
Inductor, 22nH, ±2%, 300mΩ, 400mA, SMD 0402; Manufacturer: Chilisin Elec; Manufacturer Part Number: CS0402-22NG-S; Self-Resonant Frequency: 2.8MHz; Q Factor: 25@250MHz; Package Size: 0402; JLCPCB Basic Part: No; JLCPCB Part Number: C329621; Supplier 1: LCSC; Category: Inductors; Supplier Part Number 1: C329621; Tolerance: ±2%; Rated Current: 400mA; DC Resistance: 300mΩ; RoHS: Yes; ComponentLink1Description: Datasheet; ComponentLink1URL: https://wmsc.lcsc.com/wmsc/upload/file/pdf/v2/lcsc/2304140030_Chilisin-Elec-CS0402-22NG-S_C329621.pdf; ComponentLink2Description: JLCPCB Part URL; ComponentLink2URL: https://jlcpcb.com/partdetail/C329621; ComponentLink3Description: LCSC Part URL; ComponentLink3URL: https://lcsc.com/product-detail/Inductors-SMD_Chilisin-Elec-Chilisin-Elec-CS0402-22NG-S_C329621.html
footprint IND-0402 (0402 (1005M) Inductor)
pins: 1, 2

## CS0402-24NJ-S
designator L?  Inductance: 24nH
Inductor, 24nH, ±5%, 300mΩ, 400mA, SMD 0402; Manufacturer: Chilisin Elec; Manufacturer Part Number: CS0402-24NJ-S; Self-Resonant Frequency: 2.7MHz; Q Factor: 25@250MHz; Package Size: 0402; JLCPCB Basic Part: No; JLCPCB Part Number: C142185; Supplier 1: LCSC; Category: Inductors; Supplier Part Number 1: C142185; Tolerance: ±5%; Rated Current: 400mA; DC Resistance: 300mΩ; RoHS: Yes; ComponentLink1Description: Datasheet; ComponentLink1URL: https://wmsc.lcsc.com/wmsc/upload/file/pdf/v2/lcsc/2304140030_Chilisin-Elec-CS0402-24NJ-S_C142185.pdf; ComponentLink2Description: JLCPCB Part URL; ComponentLink2URL: https://jlcpcb.com/partdetail/C142185; ComponentLink3Description: LCSC Part URL; ComponentLink3URL: https://lcsc.com/product-detail/Inductors-SMD_Chilisin-Elec-Chilisin-Elec-CS0402-24NJ-S_C142185.html
footprint IND-0402 (0402 (1005M) Inductor)
pins: 1, 2

## CS0402-27NG-S
designator L?  Inductance: 27nH
Inductor, 27nH, ±2%, 300mΩ, 400mA, SMD 0402; Manufacturer: Chilisin Elec; Manufacturer Part Number: CS0402-27NG-S; Self-Resonant Frequency: 2.48MHz; Q Factor: 24@250MHz; Package Size: 0402; JLCPCB Basic Part: No; JLCPCB Part Number: C142184; Supplier 1: LCSC; Category: Inductors; Supplier Part Number 1: C142184; Tolerance: ±2%; Rated Current: 400mA; DC Resistance: 300mΩ; RoHS: Yes; ComponentLink1Description: Datasheet; ComponentLink1URL: https://wmsc.lcsc.com/wmsc/upload/file/pdf/v2/lcsc/2304140030_Chilisin-Elec-CS0402-27NG-S_C142184.pdf; ComponentLink2Description: JLCPCB Part URL; ComponentLink2URL: https://jlcpcb.com/partdetail/C142184; ComponentLink3Description: LCSC Part URL; ComponentLink3URL: https://lcsc.com/product-detail/Inductors-SMD_Chilisin-Elec-Chilisin-Elec-CS0402-27NG-S_C142184.html
footprint IND-0402 (0402 (1005M) Inductor)
pins: 1, 2

## CS0402-27NJ-S
designator L?  Inductance: 27nH
Inductor, 27nH, ±5%, 300mΩ, 400mA, SMD 0402; Manufacturer: Chilisin Elec; Manufacturer Part Number: CS0402-27NJ-S; Self-Resonant Frequency: 2.48MHz; Q Factor: 24@250MHz; Package Size: 0402; JLCPCB Basic Part: No; JLCPCB Part Number: C142183; Supplier 1: LCSC; Category: Inductors; Supplier Part Number 1: C142183; Tolerance: ±5%; Rated Current: 400mA; DC Resistance: 300mΩ; RoHS: Yes; ComponentLink1Description: Datasheet; ComponentLink1URL: https://wmsc.lcsc.com/wmsc/upload/file/pdf/v2/lcsc/2304140030_Chilisin-Elec-CS0402-27NJ-S_C142183.pdf; ComponentLink2Description: JLCPCB Part URL; ComponentLink2URL: https://jlcpcb.com/partdetail/C142183; ComponentLink3Description: LCSC Part URL; ComponentLink3URL: https://lcsc.com/product-detail/Inductors-SMD_Chilisin-Elec-Chilisin-Elec-CS0402-27NJ-S_C142183.html
footprint IND-0402 (0402 (1005M) Inductor)
pins: 1, 2

## CS0402-30NJ-S
designator L?  Inductance: 30nH
Inductor, 30nH, ±5%, 350mΩ, 400mA, SMD 0402; Manufacturer: Chilisin Elec; Manufacturer Part Number: CS0402-30NJ-S; Self-Resonant Frequency: 2.35MHz; Q Factor: 25@250MHz; Package Size: 0402; JLCPCB Basic Part: No; JLCPCB Part Number: C329622; Supplier 1: LCSC; Category: Inductors; Supplier Part Number 1: C329622; Tolerance: ±5%; Rated Current: 400mA; DC Resistance: 350mΩ; RoHS: Yes; ComponentLink1Description: Datasheet; ComponentLink1URL: https://wmsc.lcsc.com/wmsc/upload/file/pdf/v2/lcsc/2304140030_Chilisin-Elec-CS0402-30NJ-S_C329622.pdf; ComponentLink2Description: JLCPCB Part URL; ComponentLink2URL: https://jlcpcb.com/partdetail/C329622; ComponentLink3Description: LCSC Part URL; ComponentLink3URL: https://lcsc.com/product-detail/Inductors-SMD_Chilisin-Elec-Chilisin-Elec-CS0402-30NJ-S_C329622.html
footprint IND-0402 (0402 (1005M) Inductor)
pins: 1, 2

## CS0402-33NG-S
designator L?  Inductance: 33nH
Inductor, 33nH, ±2%, 400mΩ, 400mA, SMD 0402; Manufacturer: Chilisin Elec; Manufacturer Part Number: CS0402-33NG-S; Self-Resonant Frequency: 2.35MHz; Q Factor: 24@250MHz; Package Size: 0402; JLCPCB Basic Part: No; JLCPCB Part Number: C280258; Supplier 1: LCSC; Category: Inductors; Supplier Part Number 1: C280258; Tolerance: ±2%; Rated Current: 400mA; DC Resistance: 400mΩ; RoHS: Yes; ComponentLink1Description: Datasheet; ComponentLink1URL: https://wmsc.lcsc.com/wmsc/upload/file/pdf/v2/lcsc/2304140030_Chilisin-Elec-CS0402-33NG-S_C280258.pdf; ComponentLink2Description: JLCPCB Part URL; ComponentLink2URL: https://jlcpcb.com/partdetail/C280258; ComponentLink3Description: LCSC Part URL; ComponentLink3URL: https://lcsc.com/product-detail/Inductors-SMD_Chilisin-Elec-Chilisin-Elec-CS0402-33NG-S_C280258.html
footprint IND-0402 (0402 (1005M) Inductor)
pins: 1, 2

## CS0402-33NJ-S
designator L?  Inductance: 33nH
Inductor, 33nH, ±5%, 400mΩ, 400mA, SMD 0402; Manufacturer: Chilisin Elec; Manufacturer Part Number: CS0402-33NJ-S; Self-Resonant Frequency: 2.35MHz; Q Factor: 24@250MHz; Package Size: 0402; JLCPCB Basic Part: No; JLCPCB Part Number: C285960; Supplier 1: LCSC; Category: Inductors; Supplier Part Number 1: C285960; Tolerance: ±5%; Rated Current: 400mA; DC Resistance: 400mΩ; RoHS: Yes; ComponentLink1Description: Datasheet; ComponentLink1URL: https://wmsc.lcsc.com/wmsc/upload/file/pdf/v2/lcsc/2304140030_Chilisin-Elec-CS0402-33NJ-S_C285960.pdf; ComponentLink2Description: JLCPCB Part URL; ComponentLink2URL: https://jlcpcb.com/partdetail/C285960; ComponentLink3Description: LCSC Part URL; ComponentLink3URL: https://lcsc.com/product-detail/Inductors-SMD_Chilisin-Elec-Chilisin-Elec-CS0402-33NJ-S_C285960.html
footprint IND-0402 (0402 (1005M) Inductor)
pins: 1, 2

## CS0402-47NJ-S
designator L?  Inductance: 47nH
Inductor, 47nH, ±5%, 830mΩ, 150mA, SMD 0402; Manufacturer: Chilisin Elec; Manufacturer Part Number: CS0402-47NJ-S; Self-Resonant Frequency: 2.1MHz; Q Factor: 20@250MHz; Package Size: 0402; JLCPCB Basic Part: No; JLCPCB Part Number: C142178; Supplier 1: LCSC; Category: Inductors; Supplier Part Number 1: C142178; Tolerance: ±5%; Rated Current: 150mA; DC Resistance: 830mΩ; RoHS: Yes; ComponentLink1Description: Datasheet; ComponentLink1URL: https://wmsc.lcsc.com/wmsc/upload/file/pdf/v2/lcsc/2304140030_Chilisin-Elec-CS0402-47NJ-S_C142178.pdf; ComponentLink2Description: JLCPCB Part URL; ComponentLink2URL: https://jlcpcb.com/partdetail/C142178; ComponentLink3Description: LCSC Part URL; ComponentLink3URL: https://lcsc.com/product-detail/Inductors-SMD_Chilisin-Elec-Chilisin-Elec-CS0402-47NJ-S_C142178.html
footprint IND-0402 (0402 (1005M) Inductor)
pins: 1, 2

## CS0402-68NJ-S
designator L?  Inductance: 68nH
Inductor, 68nH, ±5%, 1.12Ω, 100mA, SMD 0402; Manufacturer: Chilisin Elec; Manufacturer Part Number: CS0402-68NJ-S; Self-Resonant Frequency: 1.62MHz; Q Factor: 22@250MHz; Package Size: 0402; JLCPCB Basic Part: No; JLCPCB Part Number: C142176; Supplier 1: LCSC; Category: Inductors; Supplier Part Number 1: C142176; Tolerance: ±5%; Rated Current: 100mA; DC Resistance: 1.12Ω; RoHS: Yes; ComponentLink1Description: Datasheet; ComponentLink1URL: https://wmsc.lcsc.com/wmsc/upload/file/pdf/v2/lcsc/2304140030_Chilisin-Elec-CS0402-68NJ-S_C142176.pdf; ComponentLink2Description: JLCPCB Part URL; ComponentLink2URL: https://jlcpcb.com/partdetail/C142176; ComponentLink3Description: LCSC Part URL; ComponentLink3URL: https://lcsc.com/product-detail/Inductors-SMD_Chilisin-Elec-Chilisin-Elec-CS0402-68NJ-S_C142176.html
footprint IND-0402 (0402 (1005M) Inductor)
pins: 1, 2

## CS0402-R18J-S
designator L?  Inductance: 180nH
Inductor, 180nH, ±5%, 2.7Ω, 50mA, SMD 0402; Manufacturer: Chilisin Elec; Manufacturer Part Number: CS0402-R18J-S; Package Size: 0402; JLCPCB Basic Part: No; JLCPCB Part Number: C2847106; Supplier 1: LCSC; Category: Inductors; Supplier Part Number 1: C2847106; Tolerance: ±5%; Rated Current: 50mA; DC Resistance: 2.7Ω; RoHS: Yes; ComponentLink1Description: Datasheet; ComponentLink1URL: https://wmsc.lcsc.com/wmsc/upload/file/pdf/v2/lcsc/2110191430_Chilisin-Elec-CS0402-R18J-S_C2847106.pdf; ComponentLink2Description: JLCPCB Part URL; ComponentLink2URL: https://jlcpcb.com/partdetail/C2847106; ComponentLink3Description: LCSC Part URL; ComponentLink3URL: https://lcsc.com/product-detail/Inductors-SMD_Chilisin-Elec-Chilisin-Elec-CS0402-R18J-S_C2847106.html
footprint IND-0402 (0402 (1005M) Inductor)
pins: 1, 2

## EBLS1005-1R0K
designator L?  Inductance: 1uH
Inductor, 1uH, ±10%, 0.9Ω, 15mA, SMD 0402; Manufacturer: HYHONGYEX; Manufacturer Part Number: EBLS1005-1R0K; Self-Resonant Frequency: 40MHz; Q Factor: 20@10MHz; Package Size: 0402; JLCPCB Basic Part: No; JLCPCB Part Number: C963787; Supplier 1: LCSC; Category: Inductors; Supplier Part Number 1: C963787; Tolerance: ±10%; Rated Current: 15mA; DC Resistance: 0.9Ω; RoHS: Yes; ComponentLink1Description: Datasheet; ComponentLink1URL: https://wmsc.lcsc.com/wmsc/upload/file/pdf/v2/lcsc/2205060945_HYHONGYEX-EBLS1005-1R0K_C963787.pdf; ComponentLink2Description: JLCPCB Part URL; ComponentLink2URL: https://jlcpcb.com/partdetail/C963787; ComponentLink3Description: LCSC Part URL; ComponentLink3URL: https://lcsc.com/product-detail/Inductors-SMD_HYHONGYEX-HYHONGYEX-EBLS1005-1R0K_C963787.html
footprint IND-0402 (0402 (1005M) Inductor)
pins: 1, 2
